# Altium footprint library Tomra_Altium_Footprints.PcbLib: 53 footprints (part 3 of 4)
Each footprint in its own frame and in the unit in brackets; x right, y up, seen from the top. Pads: shape width x height; smd on the part's side, far side on the other; paste and mask are expansions set on the pad; w line width, h text height; cw(c..) or ccw(c..) is an arc to the next point about the centre after c.
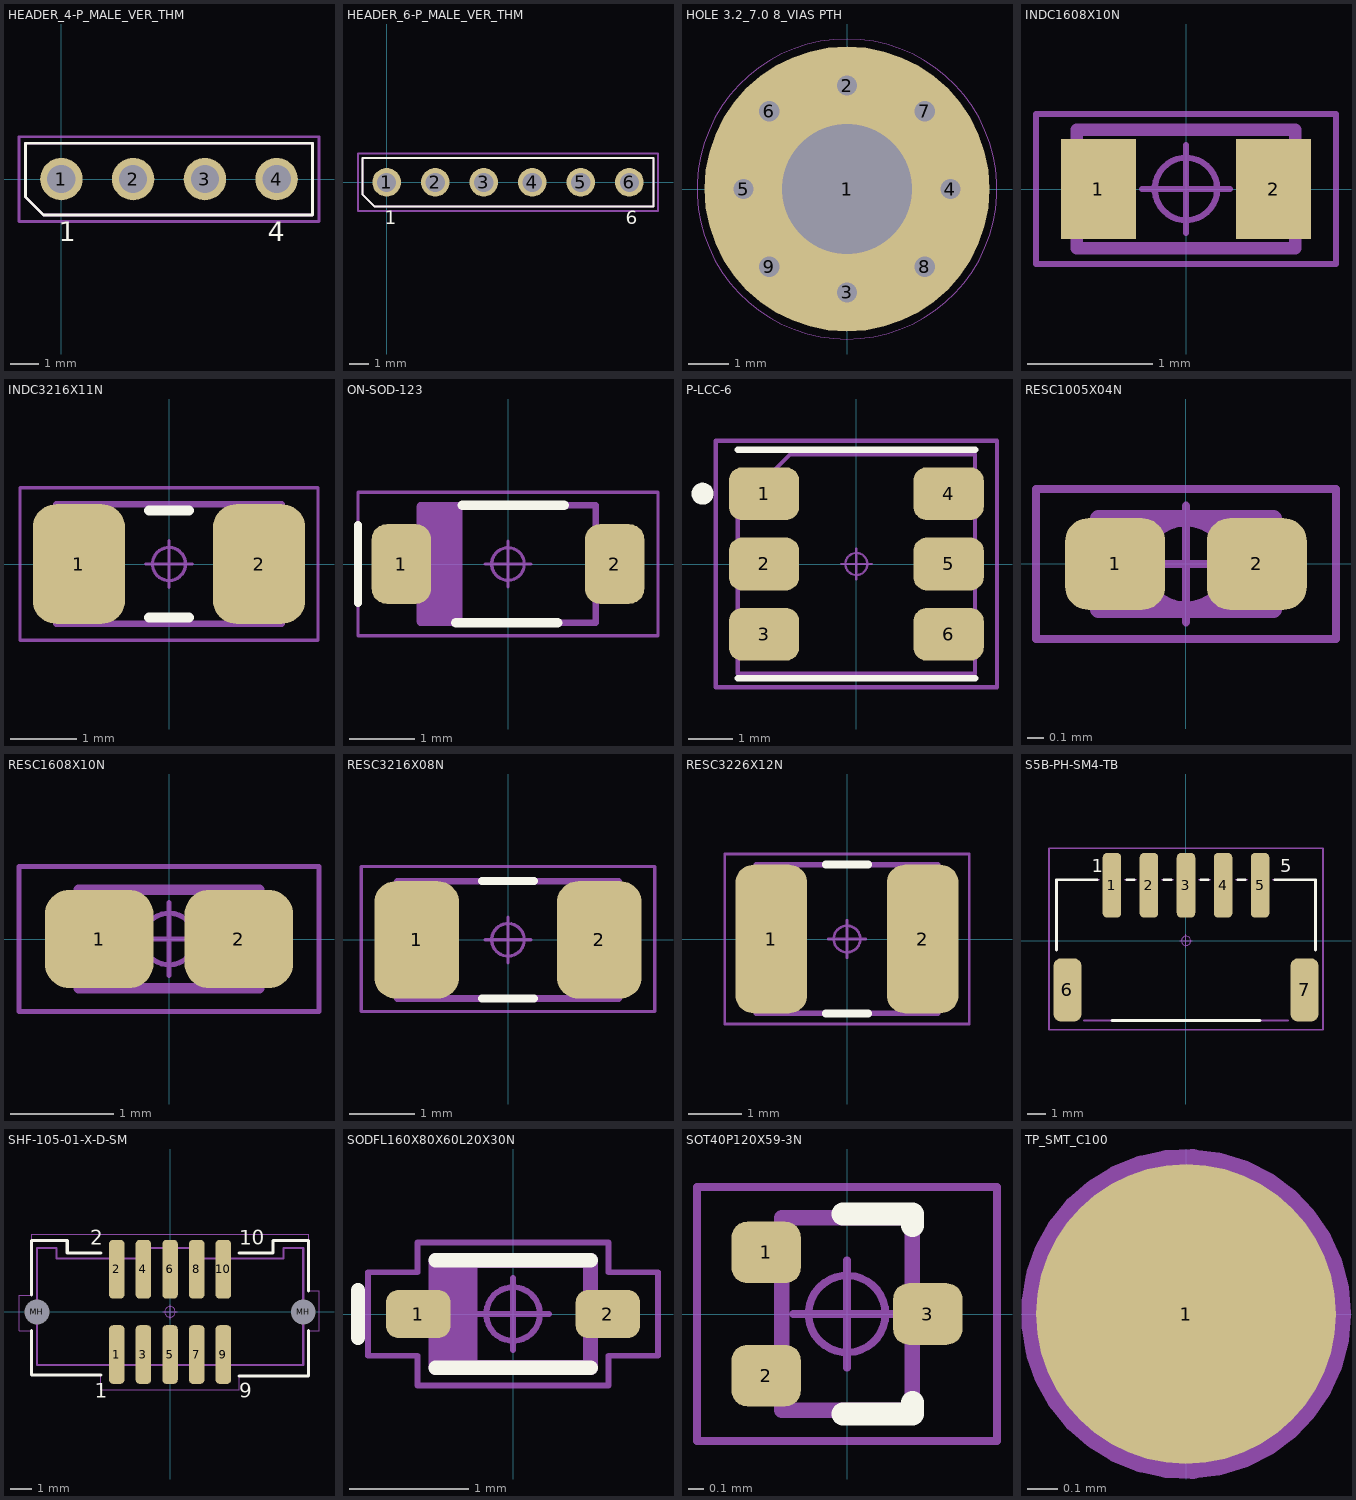
[diagram p2: the footprints below, top view; thin cyan lines are the x and y axes]

## HEADER_4-P_MALE_VER_THM [mm]
height 9
pads (4):
  round 1.5 / inner round 1.524 / far side round 1.4 hole 1 paste+0 mask+0: 1(0,0) 2(2.54,0) 3(5.08,0) 4(7.62,0)
Top Overlay:
  lines w0.1: -1.27,-0.635 -1.27,1.27 8.89,1.27 8.89,-1.27 -0.635,-1.27 -1.27,-0.635
  text "4" at 7.3,-2.2 h0.7
  text "1" at -0.1,-2.2 h0.7
Mechanical 13:
  circle w0.5: c0,-0.006 r0.2
  circle w0.5: c2.54,-0.006 r0.2
  circle w0.5: c5.08,-0.005 r0.2
  circle w0.5: c7.62,-0.006 r0.2
  circle w0.5: c7.62,-0.006 r0.2
  lines w0.1: -1.27,-0.635 -1.27,1.27 8.89,1.27 8.89,-1.27 -0.635,-1.27 -1.27,-0.635
  text "4" at 7.3,-2.2 h0.7
  text "1" at -0.1,-2.2 h0.7
  text ".Designator" at 0.2,-0.7 h1.5
Mechanical 15:
  circle w0.05: c0,0 r0.25
  lines w0.05: -0.35,0 0.35,0 ; 0,-0.35 0,0.35
  lines w0.1: 9.12,-1.5 -1.5,-1.5 -1.5,1.5 9.12,1.5 9.12,-1.48
3D body "022284041.stp": height 10.47, standoff -2.99, extent -1.28,-1.244 8.88,1.245

## HEADER_6-P_MALE_VER_THM [mm]
height 9
pads (6):
  round 1.5 / inner round 1.524 / far side round 1.4 hole 1 paste+0 mask+0: 1(0,0) 2(2.54,0) 3(5.08,0) 4(7.62,0) 5(10.16,0) 6(12.7,0)
Top Overlay:
  lines w0.1: -1.27,-0.635 -0.635,-1.27 13.97,-1.27 13.97,1.27 -1.27,1.27 -1.27,-0.635
  text "1" at -0.1,-2.2 h0.7
  text "6" at 12.5,-2.2 h0.7
Mechanical 13:
  circle w0.5: c12.7,0 r0.2
  circle w0.5: c10.16,-0.006 r0.2
  circle w0.5: c7.62,-0.006 r0.2
  circle w0.5: c7.62,-0.006 r0.2
  circle w0.5: c5.08,-0.005 r0.2
  circle w0.5: c2.54,-0.006 r0.2
  circle w0.5: c0,-0.006 r0.2
  lines w0.1: -1.27,-0.635 -0.635,-1.27 13.97,-1.27 13.97,1.27 -1.27,1.27 -1.27,-0.635
  text ".Designator" at 2.74,-0.635 h1.5
  text "1" at -0.1,-2.2 h0.7
  text "6" at 12.5,-2.2 h0.7
Mechanical 15:
  circle w0.05: c0,0 r0.25
  lines w0.05: -0.35,0 0.35,0 ; 0,-0.35 0,0.35
  lines w0.1: -1.5,-1.5 14.2,-1.5 14.2,1.5 -1.5,1.5 -1.5,-1.5
3D body "022284061.stp": height 10.47, standoff -2.99, extent -1.275,-1.25 13.965,1.239

## HOLE 3.2_7.0 8_VIAS PTH [mm]
pads (9):
  round 7 / inner round 1.524 / far side round 7 hole 3.2 paste+0 mask+0: 1(0,0)
  round 0.9 / inner round 1.524 / far side round 0.9 hole 0.5 paste+0 mask+0: 2(0,2.54) 3(0,-2.54) 4(2.54,0) 5(-2.54,0) 6(-1.905,1.905) 7(1.905,1.905) 8(1.905,-1.905) 9(-1.905,-1.905)
Mechanical 13:
  lines w0.01: 0,-3.683 ccw(c0,0) 0,3.683 ccw(c0,0) 0,-3.683

## INDC1608X10N [mm] "Chip Inductor, 2-Leads, Body 1.60x0.80mm, IPC Medium Density"
height 0.95
pads (2):
  rect 0.6x0.8 smd: 1(-0.7,0) 2(0.7,0)
Mechanical 13:
  lines w0.1: -0.875,-0.475 -0.875,0.475 0.875,0.475 0.875,-0.475 -0.875,-0.475
  text ".Designator" at -3.4,-0.6 h1.5
Mechanical 15:
  circle w0.05: c0,0 r0.25
  lines w0.05: -0.35,0 0.35,0 ; 0,-0.35 0,0.35 ; -1.2,-0.6 -1.2,0.6 1.2,0.6 1.2,-0.6 -1.2,-0.6
3D body "User Library-INDC1608X80-MURATA_LQW18A.step": height 0.81, standoff 0, extent -0.8,-0.45 0.8,0.45

## INDC3216X11N [mm] "Chip Inductor, 2-Leads, Body 3.20x1.60mm, IPC Medium Density"
height 1.1
pads (2):
  rrect50% 1.39x1.81 smd: 1(-1.36,0) 2(1.36,0)
Top Overlay:
  lines w0.15: -0.3,-0.805 0.3,-0.805 ; -0.3,0.805 0.3,0.805
Mechanical 13:
  lines w0.1: -1.7,-0.9 1.7,-0.9 1.7,0.9 -1.7,0.9 -1.7,-0.9
  text ".Designator" at -3.4,-0.6 h1.5
Mechanical 15:
  circle w0.05: c0,0 r0.25
  lines w0.05: -0.35,0 0.35,0 ; 0,-0.35 0,0.35 ; -2.25,-1.15 2.25,-1.15 2.25,1.15 -2.25,1.15 -2.25,-1.15
3D body: height 1.1, standoff 0, extent 1,-0.9 1.7,0.9
3D body: height 1.1, standoff 0, extent -1.7,-0.9 -1,0.9
3D body: height 1.1, standoff 0, extent -1,-0.9 1,0.9

## ON-SOD-123 [mm] "SOD, 2-Leads, Body 2.69x1.6mm"
height 1.35
pads (2):
  rrect50% 0.91x1.22 smd: 1(-1.635,0) 2(1.635,0)
Top Overlay:
  lines w0.12: -2.3,-0.6 -2.3,0.6
  lines w0.15: -0.8,-0.9 0.76,-0.9 ; -0.7,0.9 0.86,0.9
Mechanical 13:
  rectangle: -1.4,-0.9 -0.7,0.9
  lines w0.1: -1.345,-0.9 -1.345,0.9 1.345,0.9 1.345,-0.9 -1.345,-0.9
  text ".Designator" at -3.4,-0.6 h1.5
Mechanical 15:
  circle w0.05: c0,0 r0.25
  lines w0.05: -0.35,0 0.35,0 ; 0,-0.35 0,0.35 ; -2.3,-1.1 -2.3,1.1 2.3,1.1 2.3,-1.1 -2.3,-1.1
3D body "User Library-SOD123-1.step": height 1.18, standoff 0, extent -1.95,-0.9 1.95,0.9

## P-LCC-6 [mm] "RGB LED"
pads (6):
  rrect50% 1.6x1.2 smd: 1(-2.1,1.6) 2(-2.1,0) 3(-2.1,-1.6) 4(2.1,1.6) 5(2.1,0) 6(2.1,-1.6)
Top Overlay:
  circle w0.25: c-3.5,1.6 r0.125
  lines w0.15: -2.7,-2.6 2.7,-2.6 ; -2.7,2.6 2.7,2.6
Mechanical 13:
  lines w0.1: -2.7,-2.5 2.7,-2.5 2.7,2.5 -1.5,2.5 -2.7,1.3 -2.7,-2.5
  text ".Designator" at -3.4,-0.7 h1.5
Mechanical 15:
  circle w0.05: c0,0 r0.25
  lines w0.05: -0.35,0 0.35,0 ; 0,-0.35 0,0.35
  lines w0.1: -3.2,-2.8 -3.2,2.8 3.2,2.8 3.2,-2.8 -3.2,-2.8
3D body: height 1.6, standoff 0, extent -2.5,-2.5 2.5,2.5
3D body: height 0.95, standoff 0, extent 2.5,-2.05 2.7,-1.15
3D body: height 0.95, standoff 0, extent 2.5,-0.45 2.7,0.45
3D body: height 0.95, standoff 0, extent 2.5,1.15 2.7,2.05
3D body: height 0.95, standoff 0, extent -2.7,1.15 -2.5,2.05
3D body: height 0.95, standoff 0, extent -2.7,-0.45 -2.5,0.45
3D body: height 0.95, standoff 0, extent -2.7,-2.05 -2.5,-1.15
3D body: height 1.69, standoff 1.59, extent -2.25,-2.247 2.25,2.247

## RESC1005X04N [mm] "Chip Resistor, 2-Leads, Body 1.00x0.50mm, IPC Medium Density"
height 0.4
pads (2):
  rrect50% 0.6x0.55 smd: 1(-0.425,0) 2(0.425,0)
Mechanical 13:
  lines w0.1: -0.525,-0.275 -0.525,0.275 0.525,0.275 0.525,-0.275 -0.525,-0.275
  text ".Designator" at -3.4,-0.6 h1.5
Mechanical 15:
  circle w0.05: c0,0 r0.25
  lines w0.05: -0.35,0 0.35,0 ; 0,-0.35 0,0.35 ; -0.9,-0.45 -0.9,0.45 0.9,0.45 0.9,-0.45 -0.9,-0.45
3D body "RESC1005X04N.step": height 0.4, standoff 0, extent -0.525,-0.275 0.525,0.275

## RESC1608X10N [mm] "Chip Resistor, 2-Leads, Body 1.60x0.80mm, IPC Medium Density"
height 0.95
pads (2):
  rrect50% 1.05x0.95 smd: 1(-0.675,0) 2(0.675,0)
Mechanical 13:
  lines w0.1: -0.875,-0.475 0.875,-0.475 0.875,0.475 -0.875,0.475 -0.875,-0.475
  text ".Designator" at -3.4,-0.6 h1.5
Mechanical 15:
  circle w0.05: c0,0 r0.25
  lines w0.05: -0.35,0 0.35,0 ; 0,-0.35 0,0.35 ; -1.45,-0.7 1.45,-0.7 1.45,0.7 -1.45,0.7 -1.45,-0.7
3D body: height 0.95, standoff 0, extent 0.475,-0.475 0.875,0.475
3D body: height 0.95, standoff 0, extent -0.875,-0.475 -0.475,0.475
3D body: height 0.95, standoff 0, extent -0.475,-0.475 0.475,0.475

## RESC3216X08N [mm] "Chip Resistor, 2-Leads, Body 3.20x1.65mm, IPC Medium Density"
height 0.75
pads (2):
  rrect50% 1.3x1.8 smd: 1(-1.4,0) 2(1.4,0)
Top Overlay:
  lines w0.12: -0.4,-0.9 0.4,-0.9 ; -0.4,0.9 0.4,0.9
Mechanical 13:
  lines w0.1: -1.7,-0.9 -1.7,0.9 1.7,0.9 1.7,-0.9 -1.7,-0.9
  text ".Designator" at -3.4,-0.6 h1.5
Mechanical 15:
  circle w0.05: c0,0 r0.25
  lines w0.05: -0.35,0 0.35,0 ; 0,-0.35 0,0.35 ; -2.25,-1.1 -2.25,1.125 2.25,1.125 2.25,-1.1 -2.25,-1.1
3D body: height 0.75, standoff 0, extent -1.2,-0.9 1.2,0.9
3D body: height 0.75, standoff 0, extent -1.7,-0.9 -1.2,0.9
3D body: height 0.75, standoff 0, extent 1.2,-0.9 1.7,0.9

## RESC3226X12N [mm] "Chip Resistor, 2-Leads, Body 3.22x2.58mm, IPC Medium Density"
height 1.25
pads (2):
  rrect50% 1.35x2.8 smd: 1(-1.425,0) 2(1.425,0)
Top Overlay:
  lines w0.15: -0.4,-1.4 0.4,-1.4 ; -0.4,1.4 0.4,1.4
Mechanical 13:
  lines w0.1: -1.715,-1.4 1.715,-1.4 1.715,1.4 -1.715,1.4 -1.715,-1.4
  text ".Designator" at -3.4,-0.6 h1.5
Mechanical 15:
  circle w0.05: c0,0 r0.25
  lines w0.05: -0.35,0 0.35,0 ; 0,-0.35 0,0.35 ; -2.3,-1.6 2.3,-1.6 2.3,1.6 -2.3,1.6 -2.3,-1.6
3D body: height 1.25, standoff 0, extent 1.215,-1.4 1.715,1.4
3D body: height 1.25, standoff 0, extent -1.715,-1.4 -1.215,1.4
3D body: height 1.25, standoff 0, extent -1.215,-1.4 1.215,1.4

## S5B-PH-SM4-TB [mm] "CON JST 5-P MALE HOR SMD"
height 7
pads (7):
  rrect50% 1x3.5 smd: 1(-4,3) 2(-2,3) 3(0,3) 4(2,3) 5(4,3)
  rrect50% 1.5x3.4 smd: 6(-6.4,-2.65) 7(6.4,-2.65)
Top Overlay:
  lines w0.15: -7,-0.5 -7,3.3 -4.8,3.3 ; -4,-4.3 -0.5,-4.3 ; -3.2,3.3 -2.8,3.3 ; -2,-4.3 3,-4.3 ; -1.2,3.3 -0.8,3.3 ; 0.5,-4.3 4,-4.3 ; 0.8,3.3 1.2,3.3 ; 2.8,3.3 3.2,3.3 ; 4.8,3.3 7,3.3 7,-0.5
  text "1" at -5.1,3.7 h0.7
  text "5" at 5.1,3.7 h0.7
Mechanical 13:
  lines w0.1: -7,-0.5 -7,3.3 -4.7,3.3 ; -5.5,-4.3 -0.5,-4.3 ; -3.3,3.3 -2.7,3.3 ; -2,-4.3 3,-4.3 ; -1.3,3.3 -0.7,3.3 ; 0.5,-4.3 5.5,-4.3 ; 0.7,3.3 1.3,3.3 ; 2.7,3.3 3.3,3.3 ; 4.7,3.3 7,3.3 7,-0.5
  text "1" at -5.1,3.7 h0.7
  text ".Designator" at -3.4,-0.6 h1.5
  text "5" at 5.1,3.7 h0.7
Mechanical 15:
  circle w0.05: c0,0 r0.25
  lines w0.05: -0.35,0 0.35,0 ; 0,-0.35 0,0.35
  lines w0.1: -7.4,-4.8 -7.4,5 7.4,5 7.4,-4.8 -7.4,-4.8
3D body "S5B-PH-SM4-TB.STEP": height 5.6, standoff 0, extent -6.95,-4.3 6.95,4.3

## SHF-105-01-X-D-SM [mil]
pads (12):
  rrect50% 29x110 smd mask+2: 1(-100,-80) 2(-100,80) 3(-50,-80) 4(-50,80) 5(0,-80) 6(0,80) 7(50,-80) 8(50,80) 9(100,-80) 10(100,80)
  round 23.62 hole 46.85 unplated: MH(-250,0) MH(250,0)
Top Overlay:
  lines w5.91: -259.84,-35.43 -259.84,-118.11 -129.92,-118.11 ; -259.84,31.5 -259.84,133.86 -193,133.86 -193,110.24 -129.92,110.24 ; 129.92,-120 224.41,-120 259.84,-120 259.84,-35.43 ; 129.92,110.24 193,110.24 193,133.86 259.84,133.86 259.84,39.37
  text "1" at -141.73,-161.42 h27.56
  text "10" at 129.92,125.98 h27.56
  text "9" at 129.92,-161.42 h27.56
  text "2" at -149.61,125.98 h27.56
Mechanical 13:
  lines w3.94: -250,-100 250,-100 250,120 213,120 213,100 50,100 50,120 -50,120 -50,100 -213,100 -213,120 -250,120 -250,-100
  text ".Designator" at -133.86,-23.62 h59.06
  text "1" at -141.73,-161.42 h27.56
  text "9" at 129.92,-161.42 h27.56
  text "10" at 129.92,125.98 h27.56
  text "2" at -149.61,125.98 h27.56
Mechanical 15:
  circle w1.97: c0,0 r9.84
  lines w1.97: -13.78,0 13.78,0 ; 0,-13.78 0,13.78 ; -283.46,-35.43 -283.46,31.5 -259.84,31.5 -259.84,145.67 -125.98,145.67 129.92,145.67 193,145.67 259.84,145.67 259.84,39.37 279.53,39.37 279.53,-35.43 259.84,-35.43 259.84,-120 224.41,-120 129.92,-120 129.92,-145.67 -129.92,-145.67 -129.92,-120 -129.92,-118.11 -259.84,-118.11 -259.84,-35.43 -283.46,-35.43
3D body "SHF-105-01-L-D-SM.stp": height 213.94, standoff -1.06, extent -249.99,-120 250.01,120

## SODFL160X80X60L20X30N [mm] "SCD-80"
height 0.6
pads (2):
  rrect50% 0.54x0.4 smd: 1(-0.795,0) 2(0.795,0)
Top Overlay:
  lines w0.12: -1.3,-0.2 -1.3,0.2 ; -0.65,-0.45 0.65,-0.45 ; -0.65,0.45 0.65,0.45
Mechanical 13:
  rectangle: -0.7,-0.4 -0.3,0.4
  lines w0.12: -0.65,-0.45 -0.65,0.45 0.65,0.45 0.65,-0.45 -0.65,-0.45
  text ".Designator" at -1.778,-0.381 h0.8
Mechanical 15:
  circle w0.05: c0,0 r0.225
  lines w0.05: -0.3,0 0.3,0 ; 0,-0.3 0,0.3 ; -1.215,-0.35 -1.215,0.35 -0.8,0.35 -0.8,0.6 0.8,0.6 0.8,0.35 1.215,0.35 1.215,-0.35 0.8,-0.35 0.8,-0.6 -0.8,-0.6 -0.8,-0.35 -1.215,-0.35
Mechanical 31:
  lines w0.025: -0.8,-0.15 -0.6,-0.15 -0.6,0.15 -0.8,0.15 -0.8,-0.15 ; -0.6,-0.4 -0.6,0.4 0.6,0.4 0.6,-0.4 -0.6,-0.4 ; 0.6,-0.15 0.6,0.15 0.8,0.15 0.8,-0.15 0.6,-0.15
3D body "SODFL160X80X60L20X30.STEP": height 0.6, standoff 0, extent -0.85,-0.45 0.85,0.45

## SOT40P120X59-3N [mm] "SOT23, 3-Leads, Body 1.20x1.20mm, Pitch 0.40mm, IPC Medium Density"
height 0.59
pads (3):
  rrect50% 0.45x0.4 smd: 1(-0.525,0.4) 2(-0.525,-0.4) 3(0.525,0)
Top Overlay:
  lines w0.15: -0.025,-0.65 0.425,-0.65 0.425,-0.575 ; -0.025,0.65 0.425,0.65 0.425,0.575
Mechanical 13:
  lines w0.1: -0.425,-0.625 0.425,-0.625 0.425,0.625 -0.425,0.625 -0.425,-0.625
  text ".Designator" at -3.4,-0.6 h1.5
Mechanical 15:
  circle w0.05: c0,0 r0.25
  lines w0.05: -0.35,0 0.35,0 ; 0,-0.35 0,0.35 ; -0.975,-0.825 0.975,-0.825 0.975,0.825 -0.975,0.825 -0.975,-0.825
3D body: height 0.59, standoff 0.05, extent -0.425,-0.625 0.425,0.625

## TP_SMT_C100 [mm] "Test Point, SMT, pad 1mm"
pads (1):
  round 1 smd paste-0.5: 1(0,0)
Mechanical 13:
  circle w0.1: c0,0 r0.5
  text ".Designator" at -3.4,-0.6 h1.5
Mechanical 15:
  circle w0.05: c0,0 r0.25
  lines w0.05: -0.35,0 0.35,0 ; 0,-0.35 0,0.35